# Altium footprint library FxPcbLib.PcbLib: 112 footprints (part 7 of 7)
Each footprint in its own frame and in the unit in brackets; x right, y up, seen from the top. Pads: shape width x height; smd on the part's side, far side on the other; paste and mask are expansions set on the pad; w line width, h text height; cw(c..) or ccw(c..) is an arc to the next point about the centre after c.
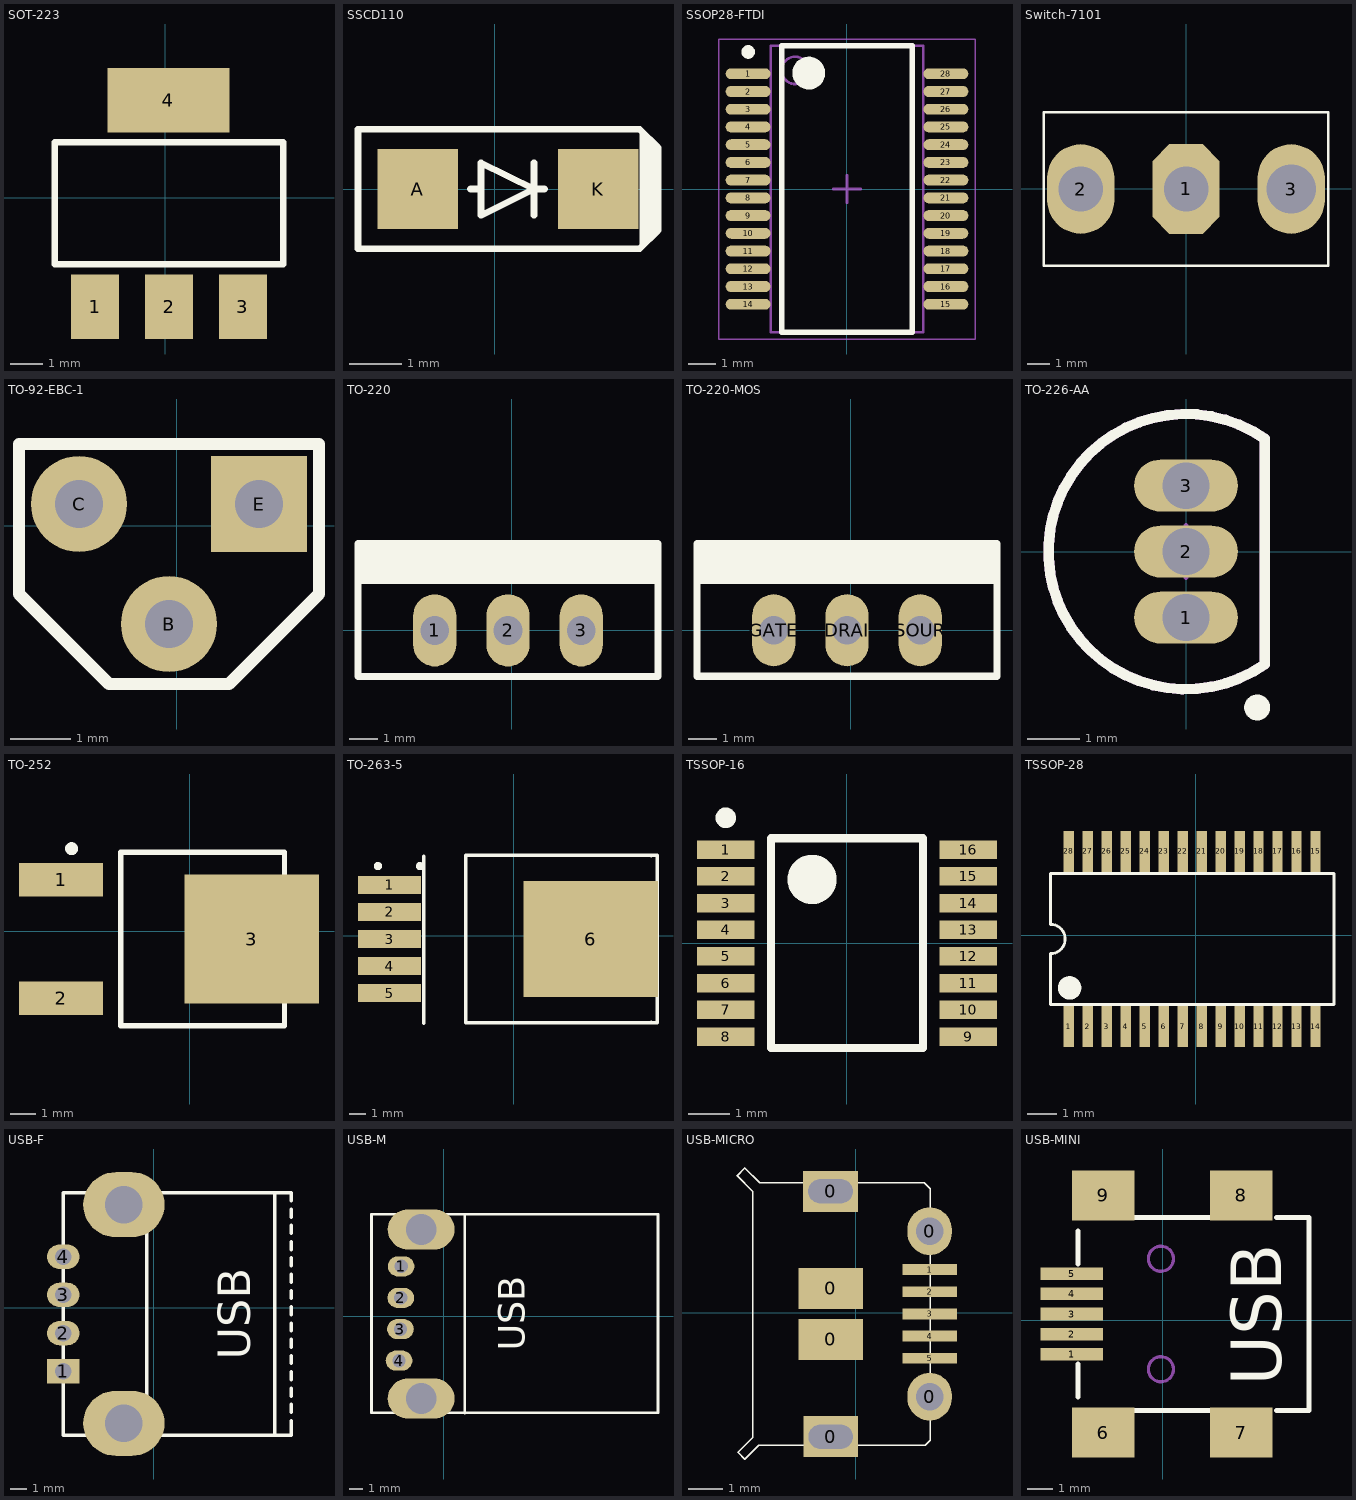
[diagram p6: the footprints below, top view; thin cyan lines are the x and y axes]

## SOT-223 [mil]
pads (4):
  rect 59x79 smd: 1(-86,-134) 2(4.55,-134) 3(95.1,-134)
  rect 150x79 smd: 4(3.88,119.54)
Top Overlay:
  lines w7.87: -135.45,-82 -135.45,68 144.55,68 144.55,-82 -135.45,-82
3D body: height 30.71, standoff -35.43, extent -122.95,-149.01 132.95,125

## SSCD110 [mil]
pads (2):
  rect 60x60 smd: A(-57.5,0) K(77.5,0)
Top Overlay:
  region: 122.2,31.56 108.43,31.56 108.43,-31.43 122.2,-31.43
  region: 115.32,-31.43 108.43,-31.43 108.43,-38.32 115.32,-38.32
  region: 113.35,-38.32 108.43,-38.32 108.43,-41.28 113.35,-41.28
  region: 119.25,-29.46 113.35,-29.46 113.35,-35.37 119.25,-35.37
  region: 116.3,37.46 108.43,37.46 108.43,31.56 116.3,31.56
  region: 119.25,34.51 114.33,34.51 114.33,30.57 119.25,30.57
  region: 113.35,42.39 108.43,42.39 108.43,37.46 113.35,37.46
  lines w5: -18.13,0 -10.26,0 ; 29.43,-19.68 29.43,19.68 ; 37.3,0 29.43,0 ; -10.26,0 -10.26,-19.68 29.43,0 ; -10.26,0 -10.26,19.68 29.43,0 ; -102.26,-44.7 108.43,-44.7 122.26,-30.86 122.26,30.99 108.43,44.83 -102.26,44.83 -102.26,-44.7
3D body: height 31.5, standoff 0, extent -54.09,-32.57 71.89,30.42

## SSOP28-FTDI [mm] "SOP, 28-Leads, Body 10.20x5.30mm, Pitch 0.65mm, IPC Medium Density"
height 2
pads (28):
  oval 1.65x0.4 smd: 1(-3.625,4.225) 2(-3.625,3.575) 3(-3.625,2.925) 4(-3.625,2.275) 5(-3.625,1.625) 6(-3.625,0.975) 7(-3.625,0.325) 8(-3.625,-0.325) 9(-3.625,-0.975) 10(-3.625,-1.625) 11(-3.625,-2.275) 12(-3.625,-2.925) 13(-3.625,-3.575) 14(-3.625,-4.225) 15(3.625,-4.225) 16(3.625,-3.575) 17(3.625,-2.925) 18(3.625,-2.275) 19(3.625,-1.625) 20(3.625,-0.975) 21(3.625,-0.325) 22(3.625,0.325) 23(3.625,0.975) 24(3.625,1.625) 25(3.625,2.275) 26(3.625,2.925) 27(3.625,3.575) 28(3.625,4.225)
Top Overlay:
  circle w0.25: c-3.625,5.025 r0.125
  circle w0.6: c-1.4,4.25 r0.3
  lines w0.2: -2.4,-5.25 -2.4,5.25 2.4,5.25 2.4,-5.25 -2.4,-5.25
Mechanical 13:
  circle w0.1: c-1.9,4.35 r0.5
  lines w0.1: -2.8,-5.25 -2.8,5.25 2.8,5.25 2.8,-5.25 -2.8,-5.25
Mechanical 15:
  lines w0.05: -4.7,-5.5 -4.7,5.5 4.7,5.5 4.7,-5.5 -4.7,-5.5
  lines w0.1: -0.5,0 0.5,0 ; 0,-0.5 0,0.5
3D body: height 2.16, standoff 0, extent -3.827,-5.139 3.929,5.191

## Switch-7101 [mm]
pads (3):
  oct 3x4 hole 2: 1(0.007,0.001)
  oval 3x4 hole 2: 2(-4.699,-0.001)
  oval 3x4 hole 2.2: 3(4.699,-0.001)
Top Overlay:
  lines w0.102: -6.35,-3.43 -6.35,3.428 6.35,3.428 6.35,-3.43 -6.35,-3.43
3D body: height 28.55, standoff -3.83, extent -6.357,-3.43 6.357,3.43

## TO-92-EBC-1 [mm]
pads (3):
  round 1.6 hole 0.8: B(-0.127,-1.635) C(-1.627,0.365)
  rect 1.6x1.6 hole 0.8: E(1.373,0.365)
Top Overlay:
  lines w0.2: -2.627,-1.135 -1.127,-2.635 0.873,-2.635 2.373,-1.135 2.373,1.365 -2.627,1.365 -2.627,-1.135
3D body: height 6.5, standoff -0.91, extent -2.413,-2.159 2.159,1.143

## TO-220 [mm]
pads (3):
  oval 1.5x2.5 hole 1: 1(-2.667,0) 2(-0.127,0) 3(2.413,0)
Top Overlay:
  region: 5.073,1.601 5.073,3.001 -5.327,3.001 -5.327,1.601
  lines w0.254: -5.327,-1.6 5.073,-1.6 5.073,3 -5.327,3 -5.327,0 -5.327,-1.6
3D body: height 18.54, standoff -3.81, extent -5.207,-1.397 4.953,3.175

## TO-220-MOS [mm]
pads (3):
  oval 1.5x2.5 hole 1: DRAI(-0.127,0) GATE(-2.667,0) SOUR(2.413,0)
Top Overlay:
  region: 5.073,1.596 5.073,2.996 -5.327,2.996 -5.327,1.596
  lines w0.254: -5.327,-1.6 -5.327,0 -5.327,3 5.073,3 5.073,-1.6 -5.327,-1.6
3D body: height 18.54, standoff -3.81, extent -5.207,-1.397 4.953,3.175

## TO-226-AA [mm]
pads (3):
  oval 2x1 hole 0.9: 1(0,-1.27) 2(0,0) 3(0,1.27)
Top Overlay:
  circle w0.25: c1.371,-3.003 r0.125
  lines w0.2: 1.52,-2.171 cw(c0,0) 1.52,2.171 1.52,-2.171
Mechanical 13:
  lines w0.2: 1.52,-2.171 cw(c0,0) 1.52,2.171 1.52,-2.171
Mechanical 15:
  lines w0.1: -0.5,0 0.5,0 ; 0,-0.5 0,0.5
3D body: height 5.33, standoff 0, extent -2.659,-2.659 1.523,2.659

## TO-252 [mm]
pads (3):
  rect 3.25x1.3 smd: 1(-4.978,1.981) 2(-4.978,-2.591)
  rect 5.2x5 smd: 3(2.388,-0.305)
Top Overlay:
  circle w0.25: c-4.571,3.185 r0.125
  lines w0.2: -2.671,-3.655 3.658,-3.655 3.658,3.045 -2.671,3.045 -2.671,-3.655
3D body: height 2.37, standoff -0.03, extent -5.793,-3.723 4.307,3.011

## TO-263-5 [mm]
pads (6):
  rect 3.85x1.1 smd: 1(-7.569,3.099) 2(-7.569,1.448) 3(-7.569,-0.203) 4(-7.569,-1.854) 5(-7.569,-3.505)
  rect 8.2x7.1 smd: 6(4.699,-0.203)
Top Overlay:
  circle w0.25: c-8.278,4.242 r0.125
  circle w0.25: c-5.713,4.242 r0.125
  lines w0.2: -5.486,-5.354 -5.486,4.846 ; -0.365,-5.303 -2.921,-5.303 -2.921,4.897 -0.365,4.897
  lines w0.203: -0.365,-5.303 8.763,-5.303 8.763,4.897 -0.365,4.897 ; 8.362,-5.303 ccw(c8.362,-5.283) 8.382,-5.283 ; 8.362,4.897 cw(c8.362,4.877) 8.382,4.877
3D body: height 4.78, standoff -0.02, extent -8.292,-5.232 7.378,4.768

## TSSOP-16 [mm]
height 1.2
pads (16):
  rect 1.4x0.45 smd: 1(-2.95,2.275) 2(-2.95,1.625) 3(-2.95,0.975) 4(-2.95,0.325) 5(-2.95,-0.325) 6(-2.95,-0.975) 7(-2.95,-1.625) 8(-2.95,-2.275) 9(2.95,-2.275) 10(2.95,-1.625) 11(2.95,-0.975) 12(2.95,-0.325) 13(2.95,0.325) 14(2.95,0.975) 15(2.95,1.625) 16(2.95,2.275)
Top Overlay:
  circle w0.6: c-0.85,1.55 r0.3
  circle w0.25: c-2.95,3.05 r0.125
  lines w0.2: -1.85,-2.55 1.85,-2.55 1.85,2.55 -1.85,2.55 -1.85,-2.55
3D body: height 1.1, standoff 0, extent -3.2,-2.5 3.2,2.5

## TSSOP-28 [mm]
pads (28):
  rect 0.35x1.4 smd: 1(-4.352,-3.127) 2(-3.702,-3.127) 3(-3.052,-3.127) 4(-2.402,-3.127) 5(-1.752,-3.127) 6(-1.102,-3.127) 7(-0.452,-3.127) 8(0.198,-3.127) 9(0.848,-3.127) 10(1.498,-3.127) 11(2.148,-3.127) 12(2.798,-3.127) 13(3.448,-3.127) 14(4.098,-3.127) 15(4.098,2.873) 16(3.448,2.873) 17(2.798,2.873) 18(2.148,2.873) 19(1.498,2.873) 20(0.848,2.873) 21(0.198,2.873) 22(-0.452,2.873) 23(-1.102,2.873) 24(-1.752,2.873) 25(-2.402,2.873) 26(-3.052,2.873) 27(-3.702,2.873) 28(-4.352,2.873)
Top Overlay:
  circle w0.5: c-4.327,-1.802 r0.15
  lines w0.1: -4.977,-2.377 -4.977,-0.627 ccw(c-4.977,-0.127) -4.977,0.373 -4.977,2.123 4.723,2.123 4.723,-2.377 -4.977,-2.377
3D body: height 1.1, standoff -0.05, extent -4.953,-3.327 4.747,3.073

## USB-F [mm]
pads (6):
  rect 2x1.5 hole 1: 1(-5.543,-3.906)
  oval 2x1.5 hole 1: 2(-5.543,-1.556) 3(-5.543,0.794) 4(-5.543,3.144)
  oval 5x4 hole 2.3: ""(-1.823,-7.101) ""(-1.823,6.339)
Top Overlay:
  lines w0.2: -0.423,-7.831 -0.423,7.069 ; 8.457,-6.931 8.457,-7.831 7.457,-7.831 ; 8.457,-6.431 8.457,-5.931 ; 8.457,-5.431 8.457,-4.931 ; 8.457,-4.431 8.457,-3.931 ; 8.457,-3.431 8.457,-2.931 ; 8.457,-2.431 8.457,-1.931 ; 8.457,-1.431 8.457,-0.931 ; 8.457,-0.431 8.457,0.069 ; 8.457,0.569 8.457,1.069 ; 8.457,1.569 8.457,2.069 ; 8.457,2.569 8.457,3.069 ; 8.457,3.569 8.457,4.069 ; 8.457,4.569 8.457,5.069 ; 8.457,5.569 8.457,6.069 ; 8.457,6.569 8.457,7.069 7.457,7.069 ; 7.457,-7.831 6.957,-7.831 -5.543,-7.831 -5.543,7.069 6.957,7.069 7.457,7.069 ; 7.457,-7.831 7.457,7.069
  text "USB" at 5.957,-3.181 h2
Bottom Overlay:
  lines w0.5: -6.558,-2.731 -4.558,-2.731 ; -6.558,-0.381 -4.558,-0.381 ; -6.558,1.969 -4.558,1.969
3D body: height 6.5, standoff -1.53, extent -4.832,-7.681 9.398,6.919

## USB-M [mm]
pads (6):
  oval 2x1.5 hole 1: 1(-3.2,3.734) 2(-3.226,1.372) 3(-3.251,-0.965) 4(-3.353,-3.327)
  oval 5x3 hole 2.3: ""(-1.702,-6.172) ""(-1.702,6.502)
Top Overlay:
  lines w0.2: 1.558,-7.272 1.558,7.628 ; 7.584,-7.247 8.584,-7.247 ; -5.416,-7.247 -5.416,7.653 7.084,7.653 16.053,7.653 16.053,-7.247 7.084,-7.247 -5.416,-7.247
  text "USB" at 6.084,-2.597 h2
Bottom Overlay:
  lines w0.5: -6.431,-2.147 -4.431,-2.147 ; -6.431,0.203 -4.431,0.203 ; -6.431,2.553 -4.431,2.553
3D body: height 4.52, standoff -1.18, extent -4.721,-6.097 15.979,6.403

## USB-MICRO [mm]
pads (11):
  rect 1.6x1.2 hole 0.7 slot 1.3 at 0 deg mask+0.051: 0(-0.741,3.561) 0(-0.737,-3.632)
  rect 1.9x1.2 smd: 0(-0.737,-0.782) 0(-0.737,0.718)
  oval 1.3x1.4 hole 0.8: 0(2.163,-2.457) 0(2.163,2.393)
  rect 1.6x0.32 smd: 1(2.163,1.268) 2(2.163,0.618) 3(2.163,-0.032) 4(2.163,-0.682) 5(2.163,-1.332)
Top Overlay:
  lines w0.05: -3.48,4.013 -3.023,3.556 -3.023,-3.632 -3.023,-3.658 -3.454,-4.089 -3.251,-4.293 -2.845,-3.886 -2.769,-3.886 2.032,-3.886 2.184,-3.734 2.184,3.632 2.007,3.81 -2.769,3.81 -2.819,3.81 -3.251,4.242 -3.48,4.013
3D body: height 2.73, standoff -0.55, extent -3.323,-4.088 2.257,3.962

## USB-MINI [mm]
pads (9):
  rect 2.5x0.5 smd: 1(-3.629,-1.346) 2(-3.629,-0.546) 3(-3.629,0.254) 4(-3.629,1.054) 5(-3.629,1.854)
  rect 2.5x2 smd: 6(-2.379,-4.471) 7(3.121,-4.471) 8(3.121,4.979) 9(-2.379,4.979)
Top Overlay:
  lines w0.2: -3.379,-3.046 -3.379,-1.746 ; -3.379,2.254 -3.379,3.554 ; -1.104,-3.596 1.921,-3.596 ; -1.104,4.104 1.921,4.104 ; 4.521,-3.596 5.821,-3.596 5.821,4.104 4.521,4.104
  text "USB" at 4.721,-2.596 h2
Mechanical 1:
  circle w0.127: c-0.079,-1.946 r0.5
  circle w0.127: c-0.079,2.454 r0.5
3D body: height 3.95, standoff -1, extent -3.203,-4.985 5.997,5.715